# Altium footprint library XU-GENARAL PCB .PcbLib: 1176 footprints (part 44 of 75)
Each footprint in its own frame and in the unit in brackets; x right, y up, seen from the top. Pads: shape width x height; smd on the part's side, far side on the other; paste and mask are expansions set on the pad; w line width, h text height; cw(c..) or ccw(c..) is an arc to the next point about the centre after c.
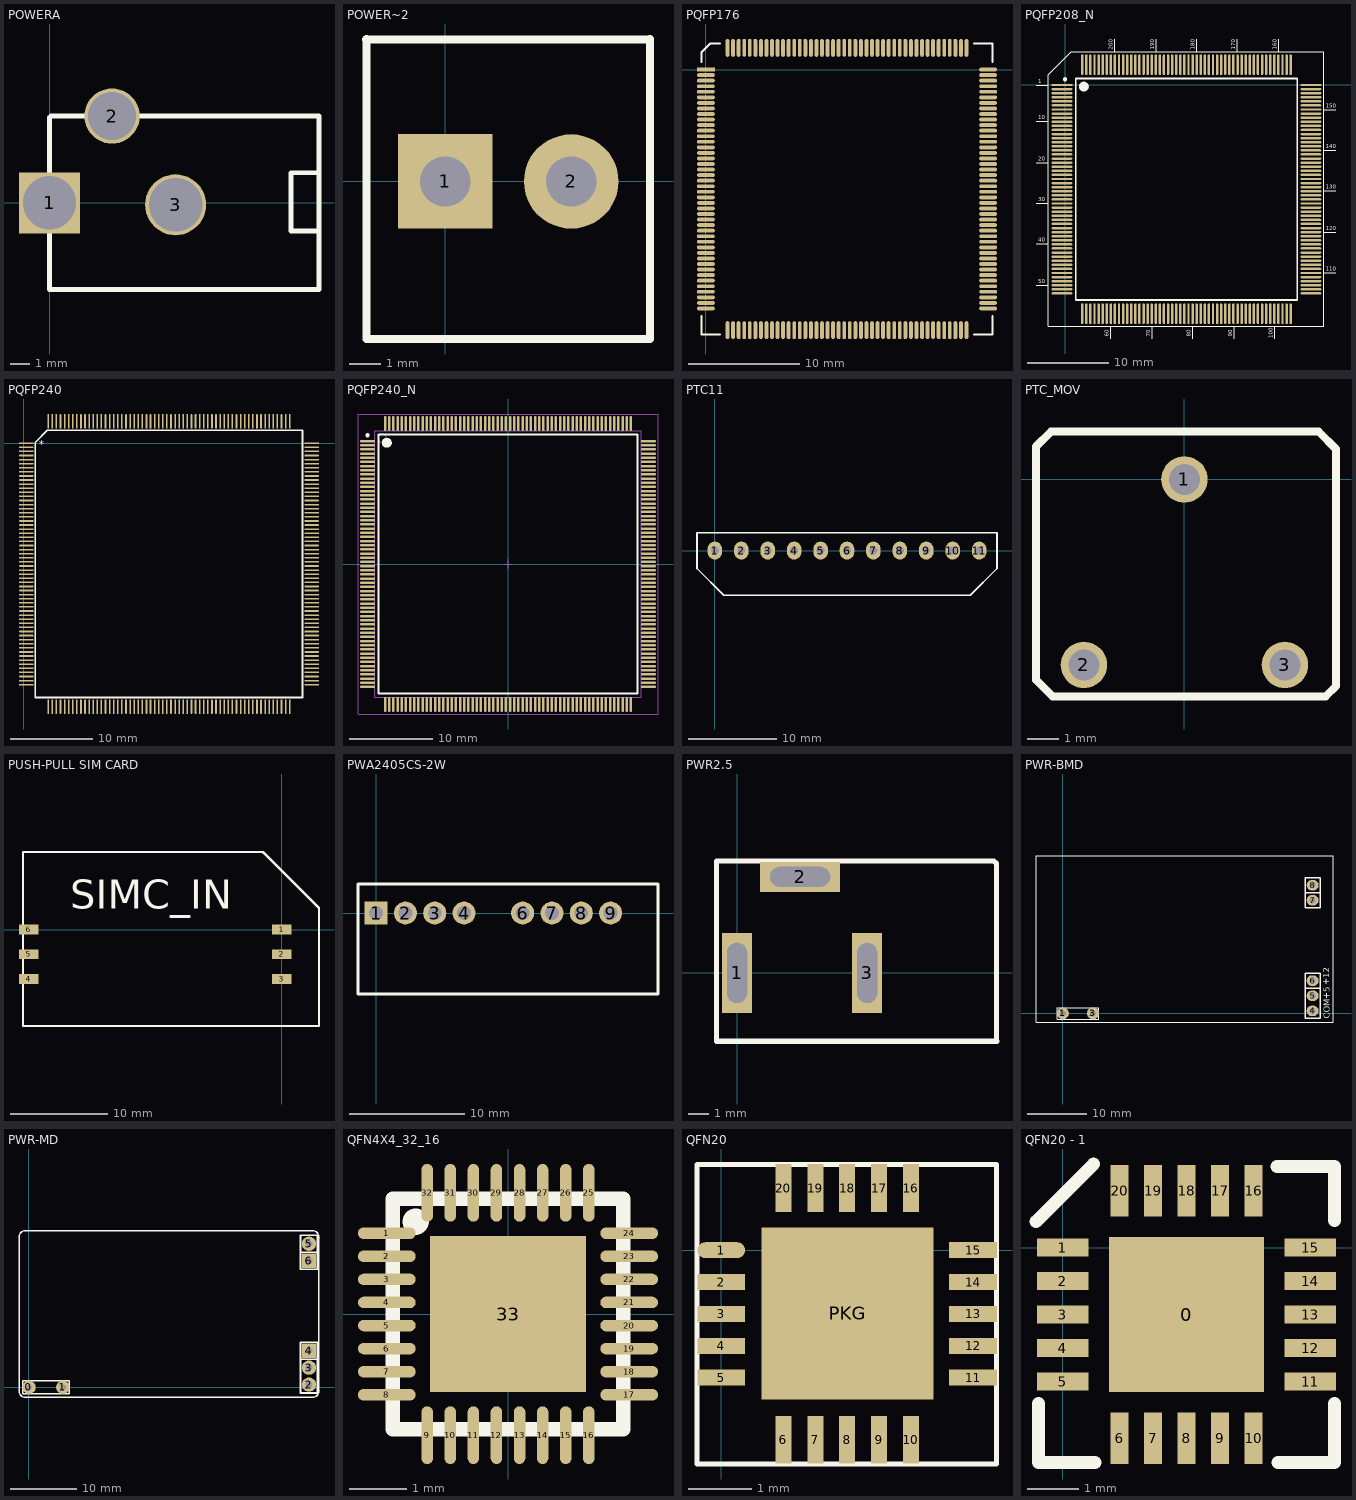
[diagram p43: the footprints below, top view; thin cyan lines are the x and y axes]

## POWERA [mm]
pads (3):
  rect 3.2x3.2 hole 2.8: 1(0,0)
  round 2.9 hole 2.5: 2(3.277,4.547)
  round 3.2 hole 2.8: 3(6.604,-0.102)
Top Overlay:
  lines w0.254: 14.097,-4.521 14.122,-4.547 ; 14.122,-1.473 12.649,-1.473 12.649,1.575 14.122,1.575 ; 14.122,-4.547 0,-4.547 0,4.47 0.076,4.547 14.122,4.547 14.122,-4.547

## POWER~2 [mm]
pads (2):
  rect 3x3 hole 1.6: 1(0,0)
  round 3 hole 1.6: 2(4,0)
Top Overlay:
  lines w0.254: -2.515,4.5 6.452,4.5 ; -2.5,-5 -2.5,4.521 ; -2.489,-5 6.502,-5 ; 6.5,-5 6.5,4.521

## PQFP176 [mm]
pads (176):
  rect 1.6x0.349 smd: 1(0,0)
  oval 1.6x0.349 smd: 2(0,-0.5) 3(0,-1) 4(0,-1.5) 5(0,-2) 6(0,-2.5) 7(0,-3) 8(0,-3.5) 9(0,-4) 10(0,-4.5) 11(0,-5) 12(0,-5.5) 13(0,-6) 14(0,-6.5) 15(0,-7) 16(0,-7.5) 17(0,-8) 18(0,-8.5) 19(0,-9) 20(0,-9.5) 21(0,-10) 22(0,-10.5) 23(0,-11) 24(0,-11.5) 25(0,-12) 26(0,-12.5) 27(0,-13) 28(0,-13.5) 29(0,-14) 30(0,-14.5) 31(0,-15) 32(0,-15.5) 33(0,-16) 34(0,-16.5) 35(0,-17) 36(0,-17.5) 37(0,-18) 38(0,-18.5) 39(0,-19) 40(0,-19.5) 41(0,-20) 42(0,-20.5) 43(0,-21) 44(0,-21.5) 89(25.4,-21.5) 90(25.4,-21) 91(25.4,-20.5) 92(25.4,-20) 93(25.4,-19.5) 94(25.4,-19) 95(25.4,-18.5) 96(25.4,-18) 97(25.4,-17.5) 98(25.4,-17) 99(25.4,-16.5) 100(25.4,-16) 101(25.4,-15.5) 102(25.4,-15) 103(25.4,-14.5) 104(25.4,-14) 105(25.4,-13.5) 106(25.4,-13) 107(25.4,-12.5) 108(25.4,-12) 109(25.4,-11.5) 110(25.4,-11) 111(25.4,-10.5) 112(25.4,-10) 113(25.4,-9.5) 114(25.4,-9) 115(25.4,-8.5) 116(25.4,-8) 117(25.4,-7.5) 118(25.4,-7) 119(25.4,-6.5) 120(25.4,-6) 121(25.4,-5.5) 122(25.4,-5) 123(25.4,-4.5) 124(25.4,-4) 125(25.4,-3.5) 126(25.4,-3) 127(25.4,-2.5) 128(25.4,-2) 129(25.4,-1.5) 130(25.4,-1) 131(25.4,-0.5) 132(25.4,0)
  oval 0.349x1.6 smd: 45(1.95,-23.45) 46(2.45,-23.45) 47(2.95,-23.45) 48(3.45,-23.45) 49(3.95,-23.45) 50(4.45,-23.45) 51(4.95,-23.45) 52(5.45,-23.45) 53(5.95,-23.45) 54(6.45,-23.45) 55(6.95,-23.45) 56(7.45,-23.45) 57(7.95,-23.45) 58(8.45,-23.45) 59(8.95,-23.45) 60(9.45,-23.45) 61(9.95,-23.45) 62(10.45,-23.45) 63(10.95,-23.45) 64(11.45,-23.45) 65(11.95,-23.45) 66(12.45,-23.45) 67(12.95,-23.45) 68(13.45,-23.45) 69(13.95,-23.45) 70(14.45,-23.45) 71(14.95,-23.45) 72(15.45,-23.45) 73(15.95,-23.45) 74(16.45,-23.45) 75(16.95,-23.45) 76(17.45,-23.45) 77(17.95,-23.45) 78(18.45,-23.45) 79(18.95,-23.45) 80(19.45,-23.45) 81(19.95,-23.45) 82(20.45,-23.45) 83(20.95,-23.45) 84(21.45,-23.45) 85(21.95,-23.45) 86(22.45,-23.45) 87(22.95,-23.45) 88(23.45,-23.45) 133(23.45,1.95) 134(22.95,1.95) 135(22.45,1.95) 136(21.95,1.95) 137(21.45,1.95) 138(20.95,1.95) 139(20.45,1.95) 140(19.95,1.95) 141(19.45,1.95) 142(18.95,1.95) 143(18.45,1.95) 144(17.95,1.95) 145(17.45,1.95) 146(16.95,1.95) 147(16.45,1.95) 148(15.95,1.95) 149(15.45,1.95) 150(14.95,1.95) 151(14.45,1.95) 152(13.95,1.95) 153(13.45,1.95) 154(12.95,1.95) 155(12.45,1.95) 156(11.95,1.95) 157(11.45,1.95) 158(10.95,1.95) 159(10.45,1.95) 160(9.95,1.95) 161(9.45,1.95) 162(8.95,1.95) 163(8.45,1.95) 164(7.95,1.95) 165(7.45,1.95) 166(6.95,1.95) 167(6.45,1.95) 168(5.95,1.95) 169(5.45,1.95) 170(4.95,1.95) 171(4.45,1.95) 172(3.95,1.95) 173(3.45,1.95) 174(2.95,1.95) 175(2.45,1.95) 176(1.95,1.95)
Top Overlay:
  lines w0.2: -0.4,-22.2 -0.4,-23.85 1.25,-23.85 ; -0.4,0.7 -0.4,1.55 0.4,2.35 1.25,2.35 ; 24.15,-23.85 25.8,-23.85 25.8,-22.2 ; 24.15,2.35 25.8,2.35 25.8,0.7

## PQFP208_N [mm]
pads (208):
  rect 2.54x0.3 smd: 1(-0.381,0)
  oval 2.54x0.3 smd: 2(-0.381,-0.5) 3(-0.381,-1) 4(-0.381,-1.5) 5(-0.381,-2) 6(-0.381,-2.5) 7(-0.381,-3) 8(-0.381,-3.5) 9(-0.381,-4) 10(-0.381,-4.5) 11(-0.381,-5) 12(-0.381,-5.5) 13(-0.381,-6) 14(-0.381,-6.5) 15(-0.381,-7) 16(-0.381,-7.5) 17(-0.381,-8) 18(-0.381,-8.5) 19(-0.381,-9) 20(-0.381,-9.5) 21(-0.381,-10) 22(-0.381,-10.5) 23(-0.381,-11) 24(-0.381,-11.5) 25(-0.381,-12) 26(-0.381,-12.5) 27(-0.381,-13) 28(-0.381,-13.5) 29(-0.381,-14) 30(-0.381,-14.5) 31(-0.381,-15) 32(-0.381,-15.5) 33(-0.381,-16) 34(-0.381,-16.5) 35(-0.381,-17) 36(-0.381,-17.5) 37(-0.381,-18) 38(-0.381,-18.5) 39(-0.381,-19) 40(-0.381,-19.5) 41(-0.381,-20) 42(-0.381,-20.5) 43(-0.381,-21) 44(-0.381,-21.5) 45(-0.381,-22) 46(-0.381,-22.5) 47(-0.381,-23) 48(-0.381,-23.5) 49(-0.381,-24) 50(-0.381,-24.5) 51(-0.381,-25) 52(-0.381,-25.5) 105(30.081,-25.5) 106(30.081,-25) 107(30.081,-24.5) 108(30.081,-24) 109(30.081,-23.5) 110(30.081,-23) 111(30.081,-22.5) 112(30.081,-22) 113(30.081,-21.5) 114(30.081,-21) 115(30.081,-20.5) 116(30.081,-20) 117(30.081,-19.5) 118(30.081,-19) 119(30.081,-18.5) 120(30.081,-18) 121(30.081,-17.5) 122(30.081,-17) 123(30.081,-16.5) 124(30.081,-16) 125(30.081,-15.5) 126(30.081,-15) 127(30.081,-14.5) 128(30.081,-14) 129(30.081,-13.5) 130(30.081,-13) 131(30.081,-12.5) 132(30.081,-12) 133(30.081,-11.5) 134(30.081,-11) 135(30.081,-10.5) 136(30.081,-10) 137(30.081,-9.5) 138(30.081,-9) 139(30.081,-8.5) 140(30.081,-8) 141(30.081,-7.5) 142(30.081,-7) 143(30.081,-6.5) 144(30.081,-6) 145(30.081,-5.5) 146(30.081,-5) 147(30.081,-4.5) 148(30.081,-4) 149(30.081,-3.5) 150(30.081,-3) 151(30.081,-2.5) 152(30.081,-2) 153(30.081,-1.5) 154(30.081,-1) 155(30.081,-0.5) 156(30.081,0)
  oval 0.3x2.54 smd: 53(2.1,-27.981) 54(2.6,-27.981) 55(3.1,-27.981) 56(3.6,-27.981) 57(4.1,-27.981) 58(4.6,-27.981) 59(5.1,-27.981) 60(5.6,-27.981) 61(6.1,-27.981) 62(6.6,-27.981) 63(7.1,-27.981) 64(7.6,-27.981) 65(8.1,-27.981) 66(8.6,-27.981) 67(9.1,-27.981) 68(9.6,-27.981) 69(10.1,-27.981) 70(10.6,-27.981) 71(11.1,-27.981) 72(11.6,-27.981) 73(12.1,-27.981) 74(12.6,-27.981) 75(13.1,-27.981) 76(13.6,-27.981) 77(14.1,-27.981) 78(14.6,-27.981) 79(15.1,-27.981) 80(15.6,-27.981) 81(16.1,-27.981) 82(16.6,-27.981) 83(17.1,-27.981) 84(17.6,-27.981) 85(18.1,-27.981) 86(18.6,-27.981) 87(19.1,-27.981) 88(19.6,-27.981) 89(20.1,-27.981) 90(20.6,-27.981) 91(21.1,-27.981) 92(21.6,-27.981) 93(22.1,-27.981) 94(22.6,-27.981) 95(23.1,-27.981) 96(23.6,-27.981) 97(24.1,-27.981) 98(24.6,-27.981) 99(25.1,-27.981) 100(25.6,-27.981) 101(26.1,-27.981) 102(26.6,-27.981) 103(27.1,-27.981) 104(27.6,-27.981) 157(27.6,2.481) 158(27.1,2.481) 159(26.6,2.481) 160(26.1,2.481) 161(25.6,2.481) 162(25.1,2.481) 163(24.6,2.481) 164(24.1,2.481) 165(23.6,2.481) 166(23.1,2.481) 167(22.6,2.481) 168(22.1,2.481) 169(21.6,2.481) 170(21.1,2.481) 171(20.6,2.481) 172(20.1,2.481) 173(19.6,2.481) 174(19.1,2.481) 175(18.6,2.481) 176(18.1,2.481) 177(17.6,2.481) 178(17.1,2.481) 179(16.6,2.481) 180(16.1,2.481) 181(15.6,2.481) 182(15.1,2.481) 183(14.6,2.481) 184(14.1,2.481) 185(13.6,2.481) 186(13.1,2.481) 187(12.6,2.481) 188(12.1,2.481) 189(11.6,2.481) 190(11.1,2.481) 191(10.6,2.481) 192(10.1,2.481) 193(9.6,2.481) 194(9.1,2.481) 195(8.6,2.481) 196(8.1,2.481) 197(7.6,2.481) 198(7.1,2.481) 199(6.6,2.481) 200(6.1,2.481) 201(5.6,2.481) 202(5.1,2.481) 203(4.6,2.481) 204(4.1,2.481) 205(3.6,2.481) 206(3.1,2.481) 207(2.6,2.481) 208(2.1,2.481)
Top Overlay:
  circle w0.25: c0,0.7 r0.125
  circle w0.6: c2.3,-0.2 r0.3
  lines w0.127: -3.556,-24.511 -2.032,-24.511 ; -3.556,-19.431 -2.032,-19.431 ; -3.556,-14.478 -2.032,-14.478 ; -3.556,-9.525 -2.032,-9.525 ; -3.556,-4.445 -2.032,-4.445 ; -3.556,-0.05 -2.032,-0.05 ; 5.588,-31.038 5.588,-29.514 ; 6.096,4.064 6.096,5.588 ; 10.668,-31.038 10.668,-29.514 ; 11.176,4.064 11.176,5.588 ; 15.621,-31.038 15.621,-29.514 ; 16.129,4.064 16.129,5.588 ; 20.701,-31.038 20.701,-29.514 ; 21.082,4.064 21.082,5.588 ; 25.654,-31.038 25.654,-29.514 ; 26.162,4.064 26.162,5.588 ; 31.623,-22.987 33.147,-22.987 ; 31.623,-18.034 33.147,-18.034 ; 31.623,-12.954 33.147,-12.954 ; 31.623,-8.001 33.147,-8.001 ; 31.623,-3.048 33.147,-3.048 ; -2.032,-29.514 -2.032,1.27 0.762,4.064 31.623,4.064 31.623,-29.514 -2.032,-29.514
  lines w0.2: 1.3,-26.3 1.3,0.8 28.4,0.8 28.4,-26.3 1.3,-26.3
  text "50" at -3.302,-24.257 h0.51
  text "20" at -3.302,-9.271 h0.51
  text "10" at -3.302,-4.191 h0.51
  text "1" at -3.302,0.204 h0.51
  text "30" at -3.302,-14.224 h0.51
  text "40" at -3.302,-19.177 h0.51
  text "140" at 31.877,-7.747 h0.51
  text "120" at 31.877,-17.78 h0.51
  text "110" at 31.877,-22.733 h0.51
  text "130" at 31.877,-12.7 h0.51
  text "150" at 31.877,-2.794 h0.51
  text "100" at 25.4,-30.988 h0.51
  text "80" at 15.367,-30.784 h0.51
  text "60" at 5.334,-30.784 h0.51
  text "70" at 10.414,-30.784 h0.51
  text "90" at 20.447,-30.784 h0.51
  text "200" at 5.842,4.318 h0.51
  text "180" at 15.875,4.318 h0.51
  text "160" at 25.908,4.318 h0.51
  text "170" at 20.828,4.318 h0.51
  text "190" at 10.922,4.318 h0.51

## PQFP240 [mm]
pads (240):
  rect 1.8x0.2 smd: 1(0.33,0)
  oval 1.8x0.2 smd: 2(0.33,-0.5) 3(0.33,-1) 4(0.33,-1.5) 5(0.33,-2) 6(0.33,-2.5) 7(0.33,-3) 8(0.33,-3.5) 9(0.33,-4) 10(0.33,-4.5) 11(0.33,-5) 12(0.33,-5.5) 13(0.33,-6) 14(0.33,-6.5) 15(0.33,-7) 16(0.33,-7.5) 17(0.33,-8) 18(0.33,-8.5) 19(0.33,-9) 20(0.33,-9.5) 21(0.33,-10) 22(0.33,-10.5) 23(0.33,-11) 24(0.33,-11.5) 25(0.33,-12) 26(0.33,-12.5) 27(0.33,-13) 28(0.33,-13.5) 29(0.33,-14) 30(0.33,-14.5) 31(0.33,-15) 32(0.33,-15.5) 33(0.33,-16) 34(0.33,-16.5) 35(0.33,-17) 36(0.33,-17.5) 37(0.33,-18) 38(0.33,-18.5) 39(0.33,-19) 40(0.33,-19.5) 41(0.33,-20) 42(0.33,-20.5) 43(0.33,-21) 44(0.33,-21.5) 45(0.33,-22) 46(0.33,-22.5) 47(0.33,-23) 48(0.33,-23.5) 49(0.33,-24) 50(0.33,-24.5) 51(0.33,-25) 52(0.33,-25.5) 53(0.33,-26) 54(0.33,-26.5) 55(0.33,-27) 56(0.33,-27.5) 57(0.33,-28) 58(0.33,-28.5) 59(0.33,-29) 60(0.33,-29.5) 121(35.179,-29.5) 122(35.179,-29) 123(35.179,-28.5) 124(35.179,-28) 125(35.179,-27.5) 126(35.179,-27) 127(35.179,-26.5) 128(35.179,-26) 129(35.179,-25.5) 130(35.179,-25) 131(35.179,-24.5) 132(35.179,-24) 133(35.179,-23.5) 134(35.179,-23) 135(35.179,-22.5) 136(35.179,-22) 137(35.179,-21.5) 138(35.179,-21) 139(35.179,-20.5) 140(35.179,-20) 141(35.179,-19.5) 142(35.179,-19) 143(35.179,-18.5) 144(35.179,-18) 145(35.179,-17.5) 146(35.179,-17) 147(35.179,-16.5) 148(35.179,-16) 149(35.179,-15.5) 150(35.179,-15) 151(35.179,-14.5) 152(35.179,-14) 153(35.179,-13.5) 154(35.179,-13) 155(35.179,-12.5) 156(35.179,-12) 157(35.179,-11.5) 158(35.179,-11) 159(35.179,-10.5) 160(35.179,-10) 161(35.179,-9.5) 162(35.179,-9) 163(35.179,-8.5) 164(35.179,-8) 165(35.179,-7.5) 166(35.179,-7) 167(35.179,-6.5) 168(35.179,-6) 169(35.179,-5.5) 170(35.179,-5) 171(35.179,-4.5) 172(35.179,-4) 173(35.179,-3.5) 174(35.179,-3) 175(35.179,-2.5) 176(35.179,-2) 177(35.179,-1.5) 178(35.179,-1) 179(35.179,-0.5) 180(35.179,0)
  oval 0.2x1.8 smd: 61(3,-32.182) 62(3.5,-32.182) 63(4,-32.182) 64(4.5,-32.182) 65(5,-32.182) 66(5.5,-32.182) 67(6,-32.182) 68(6.5,-32.182) 69(7,-32.182) 70(7.5,-32.182) 71(8,-32.182) 72(8.5,-32.182) 73(9,-32.182) 74(9.5,-32.182) 75(10,-32.182) 76(10.5,-32.182) 77(11,-32.182) 78(11.5,-32.182) 79(12,-32.182) 80(12.5,-32.182) 81(13,-32.182) 82(13.5,-32.182) 83(14,-32.182) 84(14.5,-32.182) 85(15,-32.182) 86(15.5,-32.182) 87(16,-32.182) 88(16.5,-32.182) 89(17,-32.182) 90(17.5,-32.182) 91(18,-32.182) 92(18.5,-32.182) 93(19,-32.182) 94(19.5,-32.182) 95(20,-32.182) 96(20.5,-32.182) 97(21,-32.182) 98(21.5,-32.182) 99(22,-32.182) 100(22.5,-32.182) 101(23,-32.182) 102(23.5,-32.182) 103(24,-32.182) 104(24.5,-32.182) 105(25,-32.182) 106(25.5,-32.182) 107(26,-32.182) 108(26.5,-32.182) 109(27,-32.182) 110(27.5,-32.182) 111(28,-32.182) 112(28.5,-32.182) 113(29,-32.182) 114(29.5,-32.182) 115(30,-32.182) 116(30.5,-32.182) 117(31,-32.182) 118(31.5,-32.182) 119(32,-32.182) 120(32.5,-32.182) 181(32.5,2.667) 182(32,2.667) 183(31.5,2.667) 184(31,2.667) 185(30.5,2.667) 186(30,2.667) 187(29.5,2.667) 188(29,2.667) 189(28.5,2.667) 190(28,2.667) 191(27.5,2.667) 192(27,2.667) 193(26.5,2.667) 194(26,2.667) 195(25.5,2.667) 196(25,2.667) 197(24.5,2.667) 198(24,2.667) 199(23.5,2.667) 200(23,2.667) 201(22.5,2.667) 202(22,2.667) 203(21.5,2.667) 204(21,2.667) 205(20.5,2.667) 206(20,2.667) 207(19.5,2.667) 208(19,2.667) 209(18.5,2.667) 210(18,2.667) 211(17.5,2.667) 212(17,2.667) 213(16.5,2.667) 214(16,2.667) 215(15.5,2.667) 216(15,2.667) 217(14.5,2.667) 218(14,2.667) 219(13.5,2.667) 220(13,2.667) 221(12.5,2.667) 222(12,2.667) 223(11.5,2.667) 224(11,2.667) 225(10.5,2.667) 226(10,2.667) 227(9.5,2.667) 228(9,2.667) 229(8.5,2.667) 230(8,2.667) 231(7.5,2.667) 232(7,2.667) 233(6.5,2.667) 234(6,2.667) 235(5.5,2.667) 236(5,2.667) 237(4.5,2.667) 238(4,2.667) 239(3.5,2.667) 240(3,2.667)
Top Overlay:
  lines w0.2: 1.435,-31.065 1.435,0.13 2.87,1.565 34.065,1.565 34.065,-31.065 1.435,-31.065
  text "*" at 1.854,-0.686 h1.02

## PQFP240_N [mm] "Shrink QFP, 240-Leads, Body 32x32mm, Pitch 0.5mm, IPC Medium Density"
height 4.1
pads (240):
  oval 1.8x0.3 smd: 1(-16.85,14.75) 2(-16.85,14.25) 3(-16.85,13.75) 4(-16.85,13.25) 5(-16.85,12.75) 6(-16.85,12.25) 7(-16.85,11.75) 8(-16.85,11.25) 9(-16.85,10.75) 10(-16.85,10.25) 11(-16.85,9.75) 12(-16.85,9.25) 13(-16.85,8.75) 14(-16.85,8.25) 15(-16.85,7.75) 16(-16.85,7.25) 17(-16.85,6.75) 18(-16.85,6.25) 19(-16.85,5.75) 20(-16.85,5.25) 21(-16.85,4.75) 22(-16.85,4.25) 23(-16.85,3.75) 24(-16.85,3.25) 25(-16.85,2.75) 26(-16.85,2.25) 27(-16.85,1.75) 28(-16.85,1.25) 29(-16.85,0.75) 30(-16.85,0.25) 31(-16.85,-0.25) 32(-16.85,-0.75) 33(-16.85,-1.25) 34(-16.85,-1.75) 35(-16.85,-2.25) 36(-16.85,-2.75) 37(-16.85,-3.25) 38(-16.85,-3.75) 39(-16.85,-4.25) 40(-16.85,-4.75) 41(-16.85,-5.25) 42(-16.85,-5.75) 43(-16.85,-6.25) 44(-16.85,-6.75) 45(-16.85,-7.25) 46(-16.85,-7.75) 47(-16.85,-8.25) 48(-16.85,-8.75) 49(-16.85,-9.25) 50(-16.85,-9.75) 51(-16.85,-10.25) 52(-16.85,-10.75) 53(-16.85,-11.25) 54(-16.85,-11.75) 55(-16.85,-12.25) 56(-16.85,-12.75) 57(-16.85,-13.25) 58(-16.85,-13.75) 59(-16.85,-14.25) 60(-16.85,-14.75) 121(16.85,-14.75) 122(16.85,-14.25) 123(16.85,-13.75) 124(16.85,-13.25) 125(16.85,-12.75) 126(16.85,-12.25) 127(16.85,-11.75) 128(16.85,-11.25) 129(16.85,-10.75) 130(16.85,-10.25) 131(16.85,-9.75) 132(16.85,-9.25) 133(16.85,-8.75) 134(16.85,-8.25) 135(16.85,-7.75) 136(16.85,-7.25) 137(16.85,-6.75) 138(16.85,-6.25) 139(16.85,-5.75) 140(16.85,-5.25) 141(16.85,-4.75) 142(16.85,-4.25) 143(16.85,-3.75) 144(16.85,-3.25) 145(16.85,-2.75) 146(16.85,-2.25) 147(16.85,-1.75) 148(16.85,-1.25) 149(16.85,-0.75) 150(16.85,-0.25) 151(16.85,0.25) 152(16.85,0.75) 153(16.85,1.25) 154(16.85,1.75) 155(16.85,2.25) 156(16.85,2.75) 157(16.85,3.25) 158(16.85,3.75) 159(16.85,4.25) 160(16.85,4.75) 161(16.85,5.25) 162(16.85,5.75) 163(16.85,6.25) 164(16.85,6.75) 165(16.85,7.25) 166(16.85,7.75) 167(16.85,8.25) 168(16.85,8.75) 169(16.85,9.25) 170(16.85,9.75) 171(16.85,10.25) 172(16.85,10.75) 173(16.85,11.25) 174(16.85,11.75) 175(16.85,12.25) 176(16.85,12.75) 177(16.85,13.25) 178(16.85,13.75) 179(16.85,14.25) 180(16.85,14.75)
  oval 0.3x1.8 smd: 61(-14.75,-16.85) 62(-14.25,-16.85) 63(-13.75,-16.85) 64(-13.25,-16.85) 65(-12.75,-16.85) 66(-12.25,-16.85) 67(-11.75,-16.85) 68(-11.25,-16.85) 69(-10.75,-16.85) 70(-10.25,-16.85) 71(-9.75,-16.85) 72(-9.25,-16.85) 73(-8.75,-16.85) 74(-8.25,-16.85) 75(-7.75,-16.85) 76(-7.25,-16.85) 77(-6.75,-16.85) 78(-6.25,-16.85) 79(-5.75,-16.85) 80(-5.25,-16.85) 81(-4.75,-16.85) 82(-4.25,-16.85) 83(-3.75,-16.85) 84(-3.25,-16.85) 85(-2.75,-16.85) 86(-2.25,-16.85) 87(-1.75,-16.85) 88(-1.25,-16.85) 89(-0.75,-16.85) 90(-0.25,-16.85) 91(0.25,-16.85) 92(0.75,-16.85) 93(1.25,-16.85) 94(1.75,-16.85) 95(2.25,-16.85) 96(2.75,-16.85) 97(3.25,-16.85) 98(3.75,-16.85) 99(4.25,-16.85) 100(4.75,-16.85) 101(5.25,-16.85) 102(5.75,-16.85) 103(6.25,-16.85) 104(6.75,-16.85) 105(7.25,-16.85) 106(7.75,-16.85) 107(8.25,-16.85) 108(8.75,-16.85) 109(9.25,-16.85) 110(9.75,-16.85) 111(10.25,-16.85) 112(10.75,-16.85) 113(11.25,-16.85) 114(11.75,-16.85) 115(12.25,-16.85) 116(12.75,-16.85) 117(13.25,-16.85) 118(13.75,-16.85) 119(14.25,-16.85) 120(14.75,-16.85) 181(14.75,16.85) 182(14.25,16.85) 183(13.75,16.85) 184(13.25,16.85) 185(12.75,16.85) 186(12.25,16.85) 187(11.75,16.85) 188(11.25,16.85) 189(10.75,16.85) 190(10.25,16.85) 191(9.75,16.85) 192(9.25,16.85) 193(8.75,16.85) 194(8.25,16.85) 195(7.75,16.85) 196(7.25,16.85) 197(6.75,16.85) 198(6.25,16.85) 199(5.75,16.85) 200(5.25,16.85) 201(4.75,16.85) 202(4.25,16.85) 203(3.75,16.85) 204(3.25,16.85) 205(2.75,16.85) 206(2.25,16.85) 207(1.75,16.85) 208(1.25,16.85) 209(0.75,16.85) 210(0.25,16.85) 211(-0.25,16.85) 212(-0.75,16.85) 213(-1.25,16.85) 214(-1.75,16.85) 215(-2.25,16.85) 216(-2.75,16.85) 217(-3.25,16.85) 218(-3.75,16.85) 219(-4.25,16.85) 220(-4.75,16.85) 221(-5.25,16.85) 222(-5.75,16.85) 223(-6.25,16.85) 224(-6.75,16.85) 225(-7.25,16.85) 226(-7.75,16.85) 227(-8.25,16.85) 228(-8.75,16.85) 229(-9.25,16.85) 230(-9.75,16.85) 231(-10.25,16.85) 232(-10.75,16.85) 233(-11.25,16.85) 234(-11.75,16.85) 235(-12.25,16.85) 236(-12.75,16.85) 237(-13.25,16.85) 238(-13.75,16.85) 239(-14.25,16.85) 240(-14.75,16.85)
Top Overlay:
  circle w0.6: c-14.55,14.55 r0.3
  circle w0.25: c-16.85,15.45 r0.125
  lines w0.2: -15.55,-15.55 15.55,-15.55 15.55,15.55 -15.55,15.55 -15.55,-15.55
Mechanical 13:
  circle w0.1: c-15.1,15.1 r0.5
  lines w0.1: -16,-16 16,-16 16,16 -16,16 -16,-16
Mechanical 15:
  lines w0.1: -0.5,0 0.5,0 ; 0,-0.5 0,0.5 ; -18,-18 18,-18 18,18 -18,18 -18,-18
3D body: height 4.1, standoff 0, extent -16,-16 16,16

## PTC11 [mil]
pads (11):
  oval 65x80 hole 35: 1(0,0) 2(118,0) 3(236,0) 4(354,0) 5(472,0) 6(590,0) 7(708,0) 8(826,0) 9(944,0) 10(1062,0) 11(1180,0)
Top Overlay:
  lines w8: -80,-80 40,-200 1140,-200 1260,-80 1260,80 -80,80 -80,-80

## PTC_MOV [mm]
pads (3):
  round 1.5 hole 1: 1(0,0) 2(-3.25,-6) 3(3.25,-6)
Top Overlay:
  lines w0.203: -4.266,-7.016 0.306,-7.016
  lines w0.254: -3.783,1.544 4.345,1.544 ; -3.479,1.544 -4.317,1.544 -4.799,1.061 -4.799,-6.483 -4.266,-7.016 4.573,-7.016 ; 3.227,-7.016 4.573,-7.016 ; 3.456,1.544 4.345,1.544 ; 4.345,1.544 4.903,0.985 4.903,-6.686 4.573,-7.016

## PUSH-PULL SIM CARD [mm]
pads (6):
  rect 2x1 smd: 1(0,0) 2(0,-2.54) 3(0,-5.08) 4(-26,-5.08) 5(-26,-2.54) 6(-26,0)
Top Overlay:
  lines w0.2: -1.951,7.96 -26.6,7.96 -26.6,-9.89 3.8,-9.89
  lines w0.254: -1.951,7.96 3.8,2.209 3.8,2.159 3.8,-9.89
  text "SIMC_IN" at -21.763,2.159 h3

## PWA2405CS-2W [mm]
pads (8):
  rect 2x2 hole 1.2: 1(0,0)
  round 2 hole 1.2: 2(2.54,0) 3(5.08,0) 4(7.62,0) 6(12.7,0) 7(15.24,0) 8(17.78,0) 9(20.32,0)
Top Overlay:
  lines w0.254: -1.57,-7 -1.57,2.5 24.43,2.5 24.43,-7 -1.57,-7

## PWR2.5 [mm]
pads (3):
  rect 1.5x4 hole 1 slot 3 at 90 deg: 1(0,0) 3(6.5,0)
  rect 4x1.5 hole 1 slot 3 at 0 deg: 2(3.15,4.8)
Top Overlay:
  lines w0.254: 12.954,-3.382 12.954,5.461 12.827,5.588 -1.016,5.588 -1.016,-3.412 12.984,-3.412

## PWR-BMD [mil]
pads (7):
  round 80 hole 40: 1(0,0) 3(200,0)
  oval 80x70 hole 40: 4(1653.6,16.34) 5(1653.6,116.34) 6(1653.6,216.34) 7(1653.6,747.84) 8(1653.6,847.84)
Top Overlay:
  lines w8: -177.11,-59.25 1791.39,-59.25 1791.39,1043.11 -177.11,1043.11 -177.11,-59.25 ; -38,-38 238,-38 238,38 -38,38 -38,-38
  lines w10: 1603.6,166.34 1703.6,166.34 ; 1603.6,797.83 1703.6,797.83 ; 1603.6,-33.66 1603.6,266.34 1703.6,266.34 1703.6,-33.66 1603.6,-33.66 ; 1603.6,697.83 1603.6,897.83 1703.6,897.83 1703.6,697.83 1603.6,697.83
  text "+5" at 1767,92 h40
  text "COM" at 1768,-37 h40
  text "+12" at 1764,186 h40

## PWR-MD [mil]
pads (7):
  round 80 hole 35: 0(0,0) 1(200,0)
  round 85 hole 40: 2(1653.6,16.34) 3(1653.6,116.34) 5(1653.6,847.84)
  rect 85x85 hole 40: 4(1653.6,216.34) 6(1653.6,747.84)
Top Overlay:
  lines w8: -59,-19.88 ccw(c-19.63,-19.88) -19.63,-59.25 1673.28,-59.25 ccw(c1673.28,-19.88) 1712.65,-19.88 1712.65,885.63 ccw(c1673.28,885.63) 1673.28,925 -19.63,925 ccw(c-19.63,885.63) -59,885.63 -59,-19.88 ; -38,-38 238,-38 238,38 -38,38 -38,-38
  lines w10: 1603.6,166.34 1703.6,166.34 ; 1603.6,797.84 1703.6,797.84 ; 1603.6,-33.66 1603.6,266.34 1703.6,266.34 1703.6,-33.66 1603.6,-33.66 ; 1603.6,697.84 1603.6,897.84 1703.6,897.84 1703.6,697.84 1603.6,697.84

## QFN4X4_32_16 [mm]
pads (33):
  oval 1x0.2 smd: 1(-2.1,1.4) 2(-2.1,1) 3(-2.1,0.6) 4(-2.1,0.2) 5(-2.1,-0.2) 6(-2.1,-0.6) 7(-2.1,-1) 8(-2.1,-1.4) 17(2.1,-1.4) 18(2.1,-1) 19(2.1,-0.6) 20(2.1,-0.2) 21(2.1,0.2) 22(2.1,0.6) 23(2.1,1) 24(2.1,1.4)
  oval 0.2x1 smd: 9(-1.4,-2.1) 10(-1,-2.1) 11(-0.6,-2.1) 12(-0.2,-2.1) 13(0.2,-2.1) 14(0.6,-2.1) 15(1,-2.1) 16(1.4,-2.1) 25(1.4,2.1) 26(1,2.1) 27(0.6,2.1) 28(0.2,2.1) 29(-0.2,2.1) 30(-0.6,2.1) 31(-1,2.1) 32(-1.4,2.1)
  rect 2.7x2.7 smd: 33(0,0)
Top Overlay:
  circle w0.254: c-1.6,1.6 r0.1
  lines w0.254: -2,-2 2,-2 2,2 -2,2 -2,-2

## QFN20 [mm]
pads (21):
  oval 0.75x0.25 smd: 1(0,0)
  rect 0.75x0.25 smd: 2(0,-0.5) 3(0,-1) 4(0,-1.5) 5(0,-2) 11(3.95,-2) 12(3.95,-1.5) 13(3.95,-1) 14(3.95,-0.5) 15(3.95,0)
  rect 0.25x0.75 smd: 6(0.975,-2.975) 7(1.475,-2.975) 8(1.975,-2.975) 9(2.475,-2.975) 10(2.975,-2.975) 16(2.975,0.975) 17(2.475,0.975) 18(1.975,0.975) 19(1.475,0.975) 20(0.975,0.975)
  rect 2.7x2.7 smd: PKG(1.981,-0.991)
Top Overlay:
  lines w0.025: 4.293,1.346 4.318,1.346
  lines w0.076: 4.293,1.346 -0.381,1.346 -0.381,-3.353 4.318,-3.353 4.318,1.346

## QFN20 - 1 [mm]
height 1.1
pads (21):
  rect 3x3 smd: 0(2.4,-1.3)
  rect 1x0.35 smd: 1(0,0) 2(0,-0.65) 3(0,-1.3) 4(0,-1.95) 5(0,-2.6) 11(4.8,-2.6) 12(4.8,-1.95) 13(4.8,-1.3) 14(4.8,-0.65) 15(4.8,0)
  rect 0.35x1 smd: 6(1.1,-3.7) 7(1.75,-3.7) 8(2.4,-3.7) 9(3.05,-3.7) 10(3.7,-3.7) 16(3.7,1.1) 17(3.05,1.1) 18(2.4,1.1) 19(1.75,1.1) 20(1.1,1.1)
Top Overlay:
  lines w0.254: -0.521,0.503 0.597,1.621 ; -0.47,-3.027 -0.47,-4.17 0.622,-4.17 ; 4.153,1.57 5.27,1.57 5.27,0.529 ; 4.178,-4.17 5.27,-4.17 5.27,-3.027